# Altium footprint library PCB_Library.PcbLib: 110 footprints (part 2 of 7)
Each footprint in its own frame and in the unit in brackets; x right, y up, seen from the top. Pads: shape width x height; smd on the part's side, far side on the other; paste and mask are expansions set on the pad; w line width, h text height; cw(c..) or ccw(c..) is an arc to the next point about the centre after c.
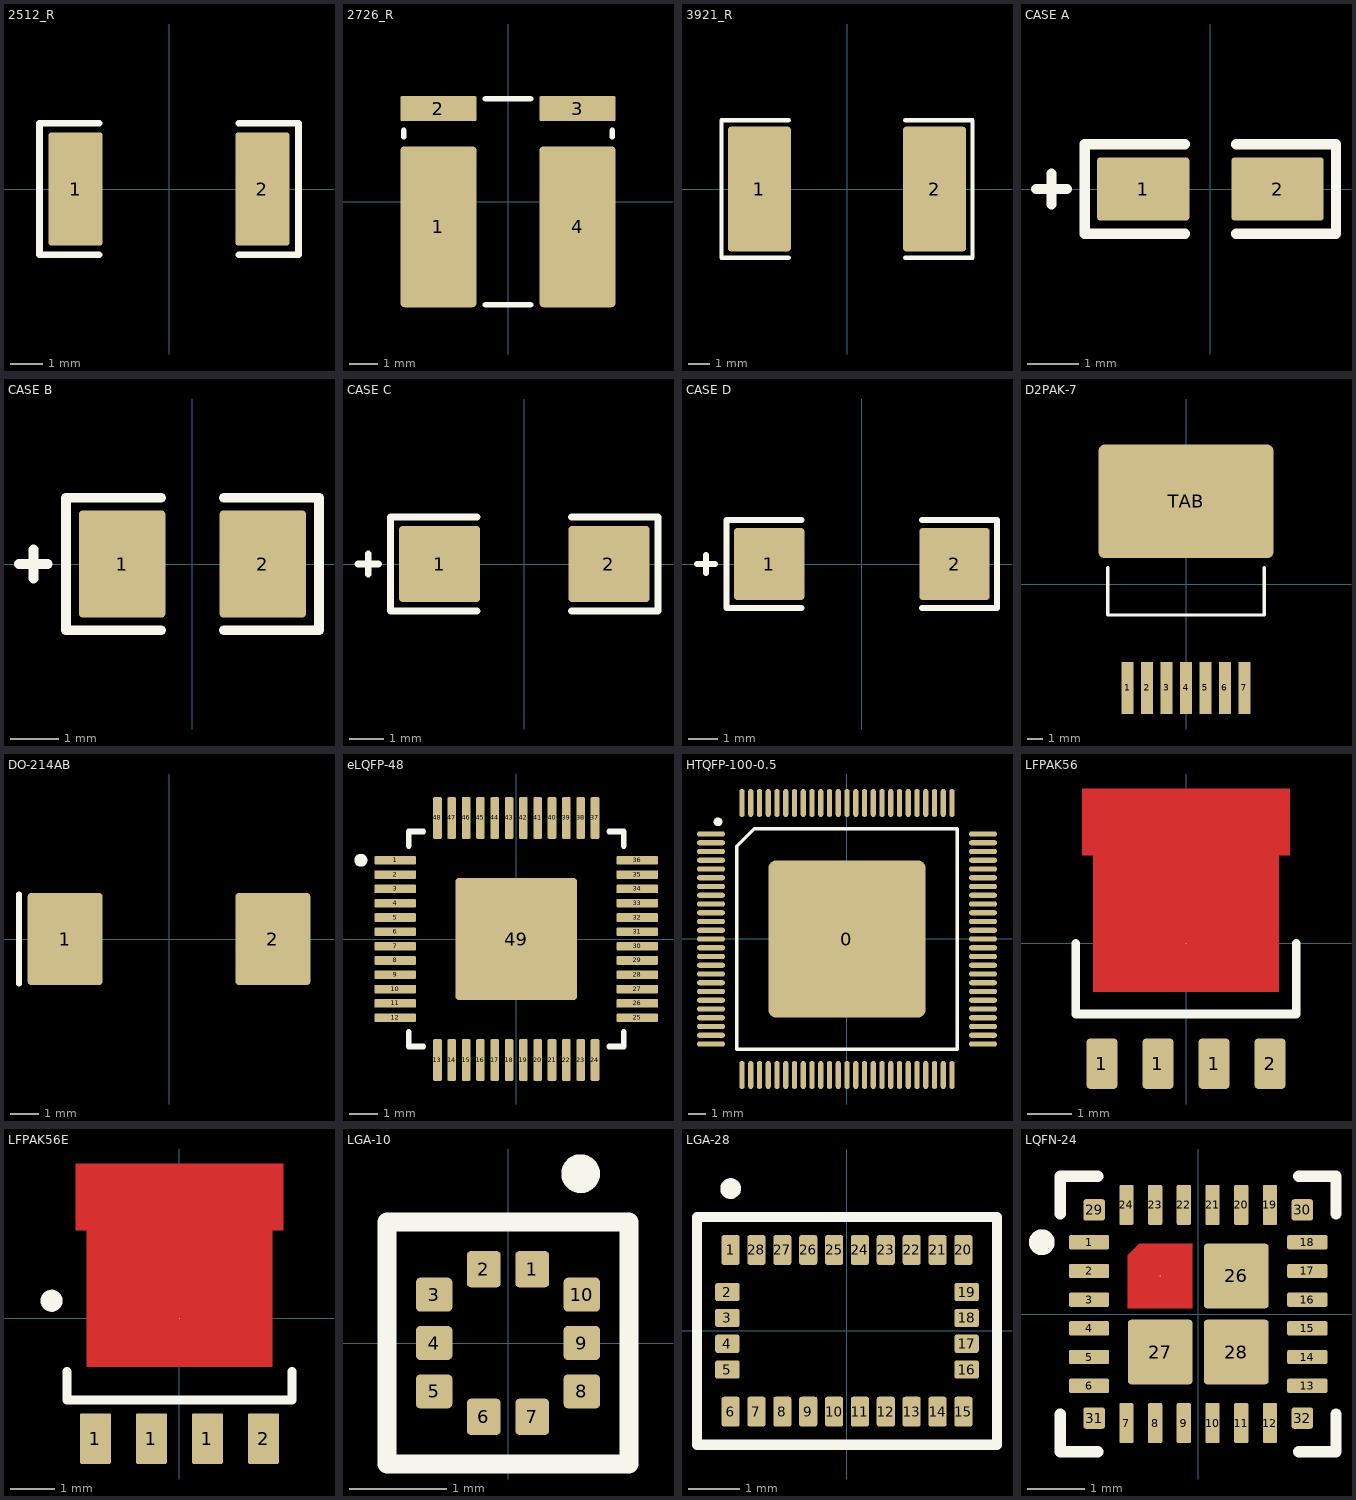
[diagram p1: the footprints below, top view; thin cyan lines are the x and y axes]

## 2512_R [mm]
height 0.89
pads (2):
  rrect10% 1.65x3.45 smd paste-0.12 mask+0.05: 1(-2.85,0) 2(2.85,0)
Top Overlay:
  lines w0.2: -2.125,-2 -3.95,-2 -3.95,2 -2.125,2 ; 2.125,-2 3.95,-2 3.95,2 2.125,2
3D body "User Library-RESC6432X06.step": height 0.6, standoff 0, extent -3.2,-1.6 3.2,1.6

## 2726_R [mm]
pads (4):
  rrect10% 2.69x5.71 smd paste-0.2 mask+0.05: 1(-2.465,-0.89) 4(2.465,-0.89)
  rrect10% 2.69x0.89 smd paste-0.07 mask+0.05: 2(-2.465,3.3) 3(2.465,3.3)
Top Overlay:
  lines w0.2: -3.7,2.3 -3.7,2.525 ; -0.8,-3.65 0.8,-3.65 ; -0.8,3.65 0.8,3.65 ; 3.7,2.3 3.7,2.525
3D body "WSL2726 (0.002).step": height 2.91, standoff 0.01, extent -3.45,-3 3.45,3.6

## 3921_R [mm]
pads (2):
  rrect10% 3x5.95 smd paste-5 mask+0.05: 1(-4.175,0) 2(4.175,0)
Top Overlay:
  lines w0.2: -2.775,-3.275 -5.975,-3.275 -5.975,3.275 -2.775,3.275 ; 2.775,-3.275 5.975,-3.275 5.975,3.275 2.775,3.275
Top Paste:
  rectangle: -5.425,0.275 -2.925,2.525
  rectangle: -5.425,-2.525 -2.925,-0.275
  rectangle: 2.925,0.275 5.425,2.525
  rectangle: 2.925,-2.525 5.425,-0.275
3D body "Res_Yageo_PU3921JKMP90R001L_eec.STEP": height 1.19, standoff 0, extent -5,-2.6 5,2.6

## CASE A [mm]
pads (2):
  rrect10% 1.8x1.23 smd paste-0.08 mask+0.05: 1(-1.31,0) 2(1.31,0)
Top Overlay:
  lines w0.2: -3.4,0 -2.8,0 ; -3.1,-0.3 -3.1,0.3 ; -0.5,-0.875 -2.45,-0.875 -2.45,0.875 -0.5,0.875 ; 0.5,-0.875 2.45,-0.875 2.45,0.875 0.5,0.875
3D body "User Library-CaseA_3216-18.step": height 1.6, standoff 0, extent -1.6,-0.8 1.6,0.8

## CASE B [mm]
pads (2):
  rrect10% 1.8x2.23 smd paste-0.11 mask+0.05: 1(-1.46,0) 2(1.46,0)
Top Overlay:
  lines w0.2: -3.6,0 -3,0 ; -3.3,-0.3 -3.3,0.3 ; -0.65,-1.375 -2.625,-1.375 -2.625,1.375 -0.65,1.375 ; 0.65,-1.375 2.625,-1.375 2.625,1.375 0.65,1.375
3D body "User Library-CaseB_3528-21.step": height 1.9, standoff 0, extent -1.75,-1.4 1.75,1.4

## CASE C [mm]
pads (2):
  rrect10% 2.37x2.23 smd paste-0.12 mask+0.05: 1(-2.47,0) 2(2.47,0)
Top Overlay:
  lines w0.2: -4.85,0 -4.25,0 ; -4.55,-0.3 -4.55,0.3 ; -1.375,-1.375 -3.9,-1.375 -3.9,1.375 -1.375,1.375 ; 1.375,-1.375 3.9,-1.375 3.9,1.375 1.375,1.375
3D body "User Library-CaseC_6032-28.step": height 2.5, standoff 0, extent -3,-1.6 3,1.6

## CASE D [mm]
pads (2):
  rrect10% 2.37x2.43 smd paste-0.13 mask+0.05: 1(-3.12,0) 2(3.12,0)
Top Overlay:
  lines w0.2: -5.55,0 -4.95,0 ; -5.25,-0.3 -5.25,0.3 ; -2.025,-1.475 -4.55,-1.475 -4.55,1.475 -2.025,1.475 ; 2.025,-1.475 4.55,-1.475 4.55,1.475 2.025,1.475
3D body "User Library-CaseD_7343-31.step": height 2.8, standoff 0, extent -3.65,-2.15 3.65,2.15

## D2PAK-7 [mm]
pads (8):
  rrect10% 0.8x3.4 smd paste-0.05 mask+0.1: 1(-3.81,-6.764) 2(-2.54,-6.764) 3(-1.27,-6.764) 4(0,-6.764) 5(1.27,-6.764) 6(2.54,-6.764) 7(3.81,-6.764)
  rrect10% 11.4x7.4 smd paste-5 mask+0.1: TAB(0,5.395)
Top Overlay:
  lines w0.2: -5.1,1.1 -5.1,-2 5.1,-2 5.1,1.1
Top Paste:
  rectangle: 0.5,2 4.5,5
  rectangle: 0.5,5.75 4.5,8.75
  rectangle: -4.5,2 -0.5,5
  rectangle: -4.5,5.75 -0.5,8.75
3D body "DPAK127P1618X450-8N.step": height 4.6, standoff 0, extent -5.125,-7.764 5.125,8.414

## DO-214AB [mm]
pads (2):
  rrect10% 2.6x3.2 smd paste-0.2 mask+0.05: 1(-3.6,0) 2(3.6,0)
Top Overlay:
  lines w0.2: -5.2,-1.55 -5.2,1.55
3D body "User Library-DIOM8261X24.step": height 2.35, standoff -0.02, extent -4.108,-3.053 4.022,3.047

## eLQFP-48 [mm]
height 1.6
pads (49):
  rrect25% 1.45x0.3 smd paste-0.025 mask+0.05: 1(-4.225,2.75) 2(-4.225,2.25) 3(-4.225,1.75) 4(-4.225,1.25) 5(-4.225,0.75) 6(-4.225,0.25) 7(-4.225,-0.25) 8(-4.225,-0.75) 9(-4.225,-1.25) 10(-4.225,-1.75) 11(-4.225,-2.25) 12(-4.225,-2.75) 25(4.225,-2.75) 26(4.225,-2.25) 27(4.225,-1.75) 28(4.225,-1.25) 29(4.225,-0.75) 30(4.225,-0.25) 31(4.225,0.25) 32(4.225,0.75) 33(4.225,1.25) 34(4.225,1.75) 35(4.225,2.25) 36(4.225,2.75)
  rrect25% 0.3x1.45 smd paste-0.025 mask+0.05: 13(-2.75,-4.225) 14(-2.25,-4.225) 15(-1.75,-4.225) 16(-1.25,-4.225) 17(-0.75,-4.225) 18(-0.25,-4.225) 19(0.25,-4.225) 20(0.75,-4.225) 21(1.25,-4.225) 22(1.75,-4.225) 23(2.25,-4.225) 24(2.75,-4.225) 37(2.75,4.225) 38(2.25,4.225) 39(1.75,4.225) 40(1.25,4.225) 41(0.75,4.225) 42(0.25,4.225) 43(-0.25,4.225) 44(-0.75,4.225) 45(-1.25,4.225) 46(-1.75,4.225) 47(-2.25,4.225) 48(-2.75,4.225)
  rrect5% 4.25x4.25 smd paste-5 mask+0.05: 49(0,0)
Top Overlay:
  circle w0.25: c-5.425,2.75 r0.1
  lines w0.2: -3.75,-3.25 -3.75,-3.75 -3.25,-3.75 ; -3.75,3.25 -3.75,3.75 -3.25,3.75 ; 3.25,-3.75 3.75,-3.75 3.75,-3.25 ; 3.25,3.75 3.75,3.75 3.75,3.25
Top Paste:
  rectangle: -1.75,0.75 -0.75,1.75
  rectangle: -1.75,-0.5 -0.75,0.5
  rectangle: -1.75,-1.75 -0.75,-0.75
  rectangle: -0.5,-1.75 0.5,-0.75
  rectangle: -0.5,-0.5 0.5,0.5
  rectangle: -0.5,0.75 0.5,1.75
  rectangle: 0.75,0.75 1.75,1.75
  rectangle: 0.75,-0.5 1.75,0.5
  rectangle: 0.75,-1.75 1.75,-0.75
3D body "LTC7810ELXE#PBF.stp": height 1.6, standoff 0, extent -4.5,-4.5 4.5,4.5

## HTQFP-100-0.5 [mm]
height 1.1
pads (101):
  rrect10% 9x9 smd paste-0.05 mask+0.05: 0(0,0)
  oval 1.6x0.3 smd paste-0.05 mask+0.05: 1(-7.775,6) 2(-7.775,5.5) 3(-7.775,5) 4(-7.775,4.5) 5(-7.775,4) 6(-7.775,3.5) 7(-7.775,3) 8(-7.775,2.5) 9(-7.775,2) 10(-7.775,1.5) 11(-7.775,1) 12(-7.775,0.5) 13(-7.775,0) 14(-7.775,-0.5) 15(-7.775,-1) 16(-7.775,-1.5) 17(-7.775,-2) 18(-7.775,-2.5) 19(-7.775,-3) 20(-7.775,-3.5) 21(-7.775,-4) 22(-7.775,-4.5) 23(-7.775,-5) 24(-7.775,-5.5) 25(-7.775,-6) 51(7.775,-6) 52(7.775,-5.5) 53(7.775,-5) 54(7.775,-4.5) 55(7.775,-4) 56(7.775,-3.5) 57(7.775,-3) 58(7.775,-2.5) 59(7.775,-2) 60(7.775,-1.5) 61(7.775,-1) 62(7.775,-0.5) 63(7.775,0) 64(7.775,0.5) 65(7.775,1) 66(7.775,1.5) 67(7.775,2) 68(7.775,2.5) 69(7.775,3) 70(7.775,3.5) 71(7.775,4) 72(7.775,4.5) 73(7.775,5) 74(7.775,5.5) 75(7.775,6)
  oval 0.3x1.6 smd paste-0.05 mask+0.05: 26(-6,-7.775) 27(-5.5,-7.775) 28(-5,-7.775) 29(-4.5,-7.775) 30(-4,-7.775) 31(-3.5,-7.775) 32(-3,-7.775) 33(-2.5,-7.775) 34(-2,-7.775) 35(-1.5,-7.775) 36(-1,-7.775) 37(-0.5,-7.775) 38(0,-7.775) 39(0.5,-7.775) 40(1,-7.775) 41(1.5,-7.775) 42(2,-7.775) 43(2.5,-7.775) 44(3,-7.775) 45(3.5,-7.775) 46(4,-7.775) 47(4.5,-7.775) 48(5,-7.775) 49(5.5,-7.775) 50(6,-7.775) 76(6,7.775) 77(5.5,7.775) 78(5,7.775) 79(4.5,7.775) 80(4,7.775) 81(3.5,7.775) 82(3,7.775) 83(2.5,7.775) 84(2,7.775) 85(1.5,7.775) 86(1,7.775) 87(0.5,7.775) 88(0,7.775) 89(-0.5,7.775) 90(-1,7.775) 91(-1.5,7.775) 92(-2,7.775) 93(-2.5,7.775) 94(-3,7.775) 95(-3.5,7.775) 96(-4,7.775) 97(-4.5,7.775) 98(-5,7.775) 99(-5.5,7.775) 100(-6,7.775)
Top Overlay:
  circle w0.25: c-7.375,6.7 r0.125
  lines w0.2: -6.3,-6.3 6.3,-6.3 6.3,6.3 -5.3,6.3 -6.3,5.3 -6.3,-6.3
3D body "TSQFP50P1600X1600X105-100N.step": height 1.05, standoff 0, extent -8,-8 8,8

## LFPAK56 [mm]
pads (5):
  rrect25% 0.7x1.15 smd paste-0.05 mask+0.05: 1(-1.905,-2.725) 1(-0.635,-2.725) 1(0.635,-2.725) 2(1.905,-2.725)
  round 0.025 smd paste-3 mask+0.05: 3(0,0)
Top Layer:
  region: -2.35,3.5 2.35,3.5 2.35,2 2.1,2 2.1,-1.1 -2.1,-1.1 -2.1,2 -2.35,2
Top Overlay:
  lines w0.2: -2.5,0 -2.5,-1.6 2.5,-1.6 2.5,0
Top Paste:
  rectangle: -0.45,0 0.45,0.6
  rectangle: -1.6,0 -0.7,0.6
  rectangle: 0.7,-0.85 1.6,-0.25
  rectangle: 0.7,0.85 1.6,1.45
  rectangle: -1.6,0.85 -0.7,1.45
  rectangle: 0.7,0 1.6,0.6
  rectangle: -0.45,-0.85 0.45,-0.25
  rectangle: -1.6,-0.85 -0.7,-0.25
  rectangle: -0.45,0.85 0.45,1.45
  rectangle: 0.32,2.55 0.92,3.45
  rectangle: -0.92,2.55 -0.32,3.45
  rectangle: -2.2,2.55 -1.6,3.45
  rectangle: 1.6,2.55 2.2,3.45
3D body "SOT669.step": height 1.01, standoff 0.01, extent -2.405,-2.91 2.405,3.2

## LFPAK56E [mm]
pads (5):
  rrect10% 0.7x1.15 smd paste-0.05 mask+0.05: 1(-1.905,-2.725) 1(-0.635,-2.725) 1(0.635,-2.725) 2(1.905,-2.725)
  round 0.025 smd paste-5 mask+0.05: 3(0,0)
Top Layer:
  region: -2.35,3.5 2.35,3.5 2.35,2 2.1,2 2.1,-1.1 -2.1,-1.1 -2.1,2 -2.35,2
Top Overlay:
  circle w0.25: c-2.9,0.4 r0.125
  lines w0.2: -2.55,-1.2 -2.55,-1.85 2.55,-1.85 2.55,-1.2
Top Paste:
  rectangle: 1.575,2.55 2.175,3.45
  rectangle: 0.325,2.55 0.925,3.45
  rectangle: -0.925,2.55 -0.325,3.45
  rectangle: -2.175,2.55 -1.575,3.45
  rectangle: 0.7,0.85 1.6,1.45
  rectangle: -0.45,0.85 0.45,1.45
  rectangle: -1.6,0.85 -0.7,1.45
  rectangle: 0.7,-0.85 1.6,-0.25
  rectangle: -0.45,-0.85 0.45,-0.25
  rectangle: -1.6,-0.85 -0.7,-0.25
  rectangle: 0.7,0 1.6,0.6
  rectangle: -1.6,0 -0.7,0.6
  rectangle: -0.45,0 0.45,0.6
3D body "SOT1023.step": height 1.02, standoff -0.02, extent -2.55,-2.96 2.55,3.18

## LGA-10 [mm]
pads (10):
  rrect25% 0.35x0.375 smd mask+0.05: 1(0.25,0.763) 2(-0.25,0.763) 6(-0.25,-0.763) 7(0.25,-0.763)
  rrect25% 0.375x0.35 smd mask+0.05: 3(-0.763,0.5) 4(-0.763,0) 5(-0.763,-0.5) 8(0.763,-0.5) 9(0.763,0) 10(0.763,0.5)
Top Overlay:
  circle w0.2: c0.75,1.75 r0.1
  lines w0.2: -1.25,-1.25 1.25,-1.25 1.25,1.25 -1.25,1.25 -1.25,-1.25
3D body "Bosch BMP388.step": height 0.75, standoff 0, extent -1,-1 1,1

## LGA-28 [mm]
pads (28):
  rrect25% 0.35x0.575 smd mask+0.05: 1(-2.25,1.562) 6(-2.25,-1.562) 7(-1.75,-1.562) 8(-1.25,-1.562) 9(-0.75,-1.562) 10(-0.25,-1.562) 11(0.25,-1.562) 12(0.75,-1.562) 13(1.25,-1.562) 14(1.75,-1.562) 15(2.25,-1.562) 20(2.25,1.562) 21(1.75,1.562) 22(1.25,1.562) 23(0.75,1.562) 24(0.25,1.562) 25(-0.25,1.562) 26(-0.75,1.562) 27(-1.25,1.562) 28(-1.75,1.562)
  rrect25% 0.475x0.35 smd mask+0.05: 2(-2.312,0.75) 3(-2.312,0.25) 4(-2.312,-0.25) 5(-2.312,-0.75) 16(2.312,-0.75) 17(2.312,-0.25) 18(2.312,0.25) 19(2.312,0.75)
Top Overlay:
  circle w0.2: c-2.25,2.75 r0.1
  lines w0.2: -2.9,-2.2 2.9,-2.2 2.9,2.2 -2.9,2.2 -2.9,-2.2
3D body "User Library-LGA-28_5_2x3_8_0_5p-1.step": height 1.18, standoff 0, extent -2.6,-1.9 2.6,1.9

## LQFN-24 [mm]
pads (32):
  rrect25% 0.7x0.25 smd paste-0.05 mask+0.05: 1(-1.9,1.25) 2(-1.9,0.75) 3(-1.9,0.25) 4(-1.9,-0.25) 5(-1.9,-0.75) 6(-1.9,-1.25) 13(1.9,-1.25) 14(1.9,-0.75) 15(1.9,-0.25) 16(1.9,0.25) 17(1.9,0.75) 18(1.9,1.25)
  rrect25% 0.25x0.7 smd paste-0.05 mask+0.05: 7(-1.25,-1.9) 8(-0.75,-1.9) 9(-0.25,-1.9) 10(0.25,-1.9) 11(0.75,-1.9) 12(1.25,-1.9) 19(1.25,1.9) 20(0.75,1.9) 21(0.25,1.9) 22(-0.25,1.9) 23(-0.75,1.9) 24(-1.25,1.9)
  round 0.025 smd paste-0.05 mask+0.05: 25(-0.663,0.663)
  rrect10% 1.125x1.125 smd paste-0.05 mask+0.05: 26(0.663,0.663) 27(-0.663,-0.663) 28(0.663,-0.663)
  rrect25% 0.375x0.375 smd paste-0.05 mask+0.05: 29(-1.813,1.813) 30(1.813,1.813) 31(-1.813,-1.813) 32(1.813,-1.813)
Top Layer:
  region: -1.225,0.1 -0.1,0.1 -0.1,1.225 -1.023,1.225 -1.225,1.023
Top Overlay:
  circle w0.25: c-2.725,1.25 r0.1
  lines w0.2: -2.4,-1.75 -2.4,-2.4 -1.75,-2.4 ; -2.4,1.75 -2.4,2.4 -1.75,2.4 ; 1.75,-2.4 2.4,-2.4 2.4,-1.75 ; 1.75,2.4 2.4,2.4 2.4,1.75
3D body "IC_Analog_Devices_LT8642SIV#PBF_eec.STEP": height 0.25, standoff 0, extent -2.35,-2.35 2.35,2.35